# Altium footprint library hphonglib.PcbLib: 703 footprints (part 28 of 44)
Each footprint in its own frame and in the unit in brackets; x right, y up, seen from the top. Pads: shape width x height; smd on the part's side, far side on the other; paste and mask are expansions set on the pad; w line width, h text height; cw(c..) or ccw(c..) is an arc to the next point about the centre after c.
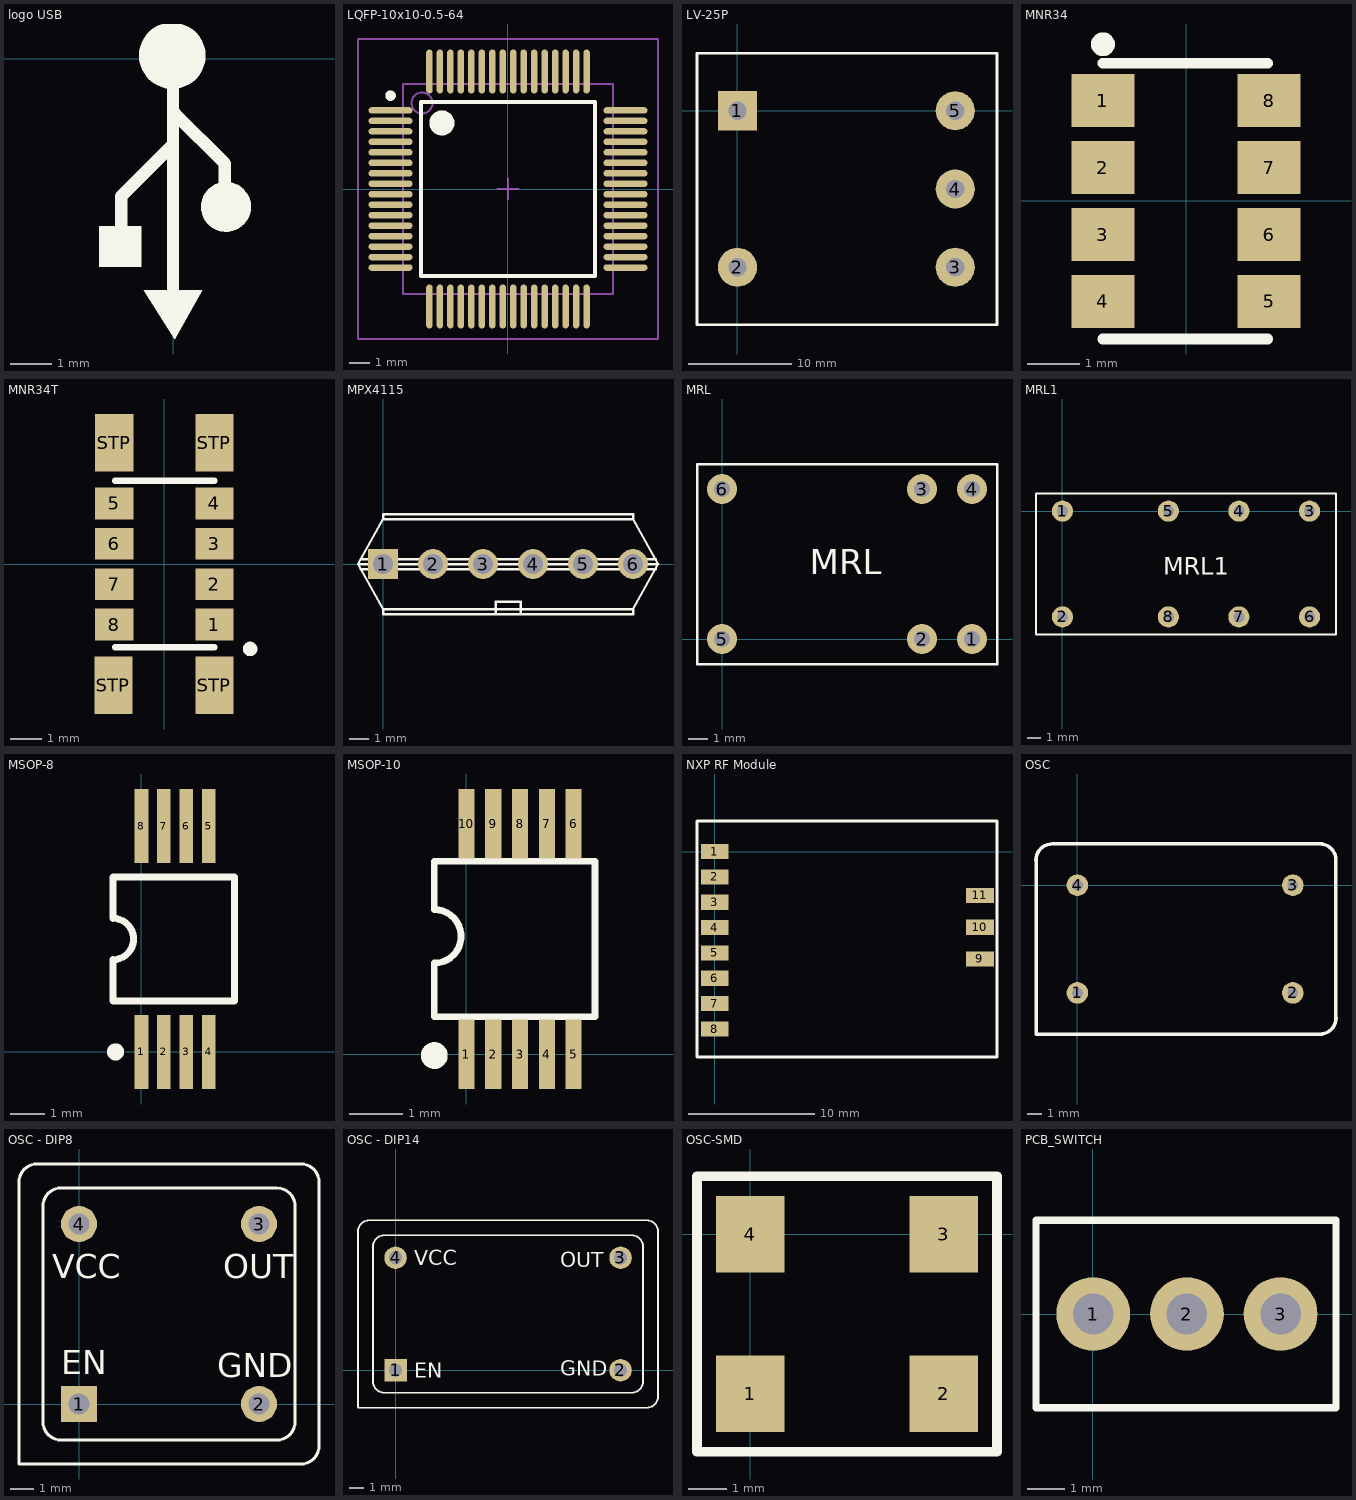
[diagram p27: the footprints below, top view; thin cyan lines are the x and y axes]

## logo USB [mm]
Top Overlay:
  circle w0.8: c-0.019,0.076 r0.4
  circle w0.6: c1.273,-3.556 r0.3
  region: -1.778,-4.014 -1.778,-5.004 -0.762,-5.004 -0.762,-4.014
  region: 0.038,-6.731 -0.699,-5.563 0.698,-5.563
  lines w0.2: 0.025,-1.324 0.05,-1.324
  lines w0.3: -1.245,-4.064 -1.245,-3.328 ; -1.245,-3.302 0,-2.058 ; 0,-5.665 0,-0.483 ; 0.05,-1.324 1.244,-2.518 1.244,-3.48

## LQFP-10x10-0.5-64 [mm] "Thin QFP, 64-Leads, Body 10x10mm, Pitch 0.5mm, IPC Low Density"
height 1.6
pads (64):
  oval 2.1x0.3 smd: 1(-5.6,3.75) 2(-5.6,3.25) 3(-5.6,2.75) 4(-5.6,2.25) 5(-5.6,1.75) 6(-5.6,1.25) 7(-5.6,0.75) 8(-5.6,0.25) 9(-5.6,-0.25) 10(-5.6,-0.75) 11(-5.6,-1.25) 12(-5.6,-1.75) 13(-5.6,-2.25) 14(-5.6,-2.75) 15(-5.6,-3.25) 16(-5.6,-3.75) 33(5.6,-3.75) 34(5.6,-3.25) 35(5.6,-2.75) 36(5.6,-2.25) 37(5.6,-1.75) 38(5.6,-1.25) 39(5.6,-0.75) 40(5.6,-0.25) 41(5.6,0.25) 42(5.6,0.75) 43(5.6,1.25) 44(5.6,1.75) 45(5.6,2.25) 46(5.6,2.75) 47(5.6,3.25) 48(5.6,3.75)
  oval 0.3x2.1 smd: 17(-3.75,-5.6) 18(-3.25,-5.6) 19(-2.75,-5.6) 20(-2.25,-5.6) 21(-1.75,-5.6) 22(-1.25,-5.6) 23(-0.75,-5.6) 24(-0.25,-5.6) 25(0.25,-5.6) 26(0.75,-5.6) 27(1.25,-5.6) 28(1.75,-5.6) 29(2.25,-5.6) 30(2.75,-5.6) 31(3.25,-5.6) 32(3.75,-5.6) 49(3.75,5.6) 50(3.25,5.6) 51(2.75,5.6) 52(2.25,5.6) 53(1.75,5.6) 54(1.25,5.6) 55(0.75,5.6) 56(0.25,5.6) 57(-0.25,5.6) 58(-0.75,5.6) 59(-1.25,5.6) 60(-1.75,5.6) 61(-2.25,5.6) 62(-2.75,5.6) 63(-3.25,5.6) 64(-3.75,5.6)
Top Overlay:
  circle w0.6: c-3.15,3.15 r0.3
  circle w0.25: c-5.6,4.45 r0.125
  lines w0.2: -4.15,-4.15 4.15,-4.15 4.15,4.15 -4.15,4.15 -4.15,-4.15
Mechanical 13:
  circle w0.1: c-4.1,4.1 r0.5
  lines w0.1: -5,-5 5,-5 5,5 -5,5 -5,-5
Mechanical 15:
  lines w0.1: -0.5,0 0.5,0 ; 0,-0.5 0,0.5 ; -7.15,-7.15 7.15,-7.15 7.15,7.15 -7.15,7.15 -7.15,-7.15
3D body: height 1.35, standoff 0, extent -6.014,-6.014 6.014,6.014

## LV-25P [mil] "Voltage Transducer LV Series; 500V"
pads (5):
  rect 150x150 hole 70: 1(0,0)
  round 150 hole 70: 2(0,-600) 3(835,-600) 4(835,-300) 5(835,0)
Top Overlay:
  lines w10: -155,-820 -155,220 995,220 995,-820 -155,-820
3D body: height 624.49, standoff -147.17, extent -104.8,-811.8 1044.8,211.82

## MNR34 [mm]
pads (8):
  rect 1.2x1 smd: 1(-1.578,1.898) 2(-1.578,0.628) 3(-1.578,-0.642) 4(-1.578,-1.912) 5(1.572,-1.912) 6(1.572,-0.642) 7(1.572,0.628) 8(1.572,1.898)
Top Overlay:
  circle w0.254: c-1.578,2.965 r0.1
  lines w0.2: -1.578,-2.623 1.546,-2.623 ; -1.578,2.609 1.546,2.609
3D body: height 1.27, standoff 0, extent -2.032,-2.286 2.032,2.286

## MNR34T [mm]
pads (12):
  rect 1.2x1 smd: 1(1.575,-1.896) 2(1.575,-0.626) 3(1.575,0.644) 4(1.575,1.914) 5(-1.575,1.914) 6(-1.575,0.644) 7(-1.575,-0.626) 8(-1.575,-1.896)
  rect 1.2x1.8 smd: STP(-1.6,-3.801) STP(-1.575,3.819) STP(1.575,-3.801) STP(1.575,3.819)
Top Overlay:
  circle w0.254: c2.694,-2.658 r0.1
  lines w0.2: -1.549,-2.607 1.575,-2.607 ; -1.549,2.625 1.575,2.625
3D body: height 2, standoff 0, extent -1.649,-2.707 1.675,2.725

## MPX4115 [mil]
pads (6):
  rect 60x60 hole 39.37 unplated: 1(0,0)
  round 60 hole 39.37 unplated: 2(100,0) 3(200,0) 4(300,0) 5(400,0) 6(500,0)
Top Overlay:
  lines w5: -45,-10 545,-10 ; -45,10 545,10 ; 225,-100 225,-75 275,-75 275,-100 ; -50,0 550,0 ; -50,0 0,-90 ; -50,0 0,90 ; 0,-90 500,-90 ; 0,-90 0,-100 500,-100 500,-90 ; 0,90 0,100 500,100 500,90 ; 0,90 500,90 ; 500,-90 550,0 ; 500,90 550,0

## MRL [mil]
pads (6):
  round 60 hole 31.49 unplated: 1(500,0) 2(400,0) 3(400,300) 4(500,300) 5(0,0) 6(0,300)
Top Overlay:
  lines w5: -50,-50 550,-50 550,350 -50,350 -50,-50
  text "MRL" at 175,130 h50

## MRL1 [mil]
pads (8):
  round 60 hole 31.49: 1(0,0) 2(0,-300) 3(700,0) 4(500,0) 5(300,0) 6(700,-300) 7(500,-300) 8(300,-300)
Top Overlay:
  lines w5: -75,-350 775,-350 775,50 -75,50 -75,-350
  text "MRL1" at 285,-180 h50

## MSOP-8 [mm] "MSOP, Plastic; 8 Leads; Body 3x3 mm; Pitch 0.65 mm"
height 1.99
pads (8):
  rect 0.4x2.15 smd: 1(0,0) 2(0.65,0) 3(1.3,0) 4(1.95,0) 5(1.95,6.55) 6(1.3,6.55) 7(0.65,6.55) 8(0,6.55)
Top Overlay:
  circle w0.25: c-0.75,0 r0.125
  lines w0.2: 2.7,1.475 -0.825,1.475 -0.825,2.675 ccw(c-0.825,3.275) -0.825,3.875 -0.825,5.075 2.7,5.075 2.7,1.5

## MSOP-10 [mm] "MSOP, Plastic; 10 Leads; Body 3x3 mm; Pitch 0.5 mm"
pads (10):
  rect 0.3x1.3 smd: 1(0,0) 2(0.5,0) 3(1,0) 4(1.5,0) 5(2,0) 6(2,4.3) 7(1.5,4.3) 8(1,4.3) 9(0.5,4.3) 10(0,4.3)
Top Overlay:
  circle w0.25: c-0.6,-0.025 r0.125
  lines w0.127: -0.6,0.7 -0.6,1.7 ccw(c-0.6,2.2) -0.6,2.7 -0.6,3.6 2.4,3.6 2.4,0.7 -0.6,0.7

## NXP RF Module [mm] "NXP Wireless Module"
pads (11):
  rect 2.2x1.2 smd: 1(0,0) 2(0,-2.007) 3(0,-4.013) 4(0,-6.02) 5(0,-8.026) 6(0,-10.033) 7(0,-12.04) 8(0,-14.046) 9(21,-8.5) 10(21,-5.986) 11(21,-3.472)
Top Overlay:
  lines w0.254: -1.397,-16.256 -1.397,2.413 22.352,2.413 22.352,-16.256 -1.397,-16.256

## OSC [mil] "Sealed Oscillator; Through-Hole; 4 Leads"
pads (4):
  round 60 hole 30: 1(0,-300) 2(600,-300) 3(600,0) 4(0,0)
Top Overlay:
  lines w10: -115.21,69.79 cw(c-70,69.79) -70,115 675,115 ; -115,70 -115,-415 675,-415 ccw(c675,-369.79) 720.21,-369.79 ; 674.79,115.21 cw(c674.79,70) 720,70 720,-370
3D body: height 215.03, standoff -225.91, extent -98.62,-398.02 698.63,98.04

## OSC - DIP8 [mil]
pads (4):
  rect 60x60 hole 35.43: 1(0,0)
  round 60 hole 35.43: 2(300,0) 3(300,300) 4(0,300)
Top Overlay:
  lines w5: 359.1,337.28 ccw(c330,330) 330,360 -30,360 ccw(c-30,330) -60,330 -60,-30 ccw(c-30,-30) -30,-60 330,-60 ccw(c330,-30) 360,-30 ; 360,-35 360,335 ; 400,370 ccw(c370,370) 370,400 -70,400 ccw(c-70,370) -100,370 -100,-100 370,-100 ccw(c370,-70) 400,-70 400,375
  text "EN" at -30,50 h40
  text "GND" at 230,45 h40
  text "OUT" at 240,210 h40
  text "VCC" at -45,210 h40

## OSC - DIP14 [mil]
pads (4):
  rect 60x60 hole 35.43: 1(0,0)
  round 60 hole 35.43: 2(600,0) 3(600,300) 4(0,300)
Top Overlay:
  lines w5: -100,-100 670,-100 ccw(c670,-70) 700,-70 700,370 ccw(c670,370) 670,400 -70,400 ccw(c-70,370) -100,370 -100,-100 ; -60,-30 ccw(c-30,-30) -30,-60 630,-60 ccw(c630,-30) 660,-30 660,330 ccw(c630,330) 630,360 -30,360 ccw(c-30,330) -60,330 -60,-30
  text "VCC" at 50,280 h40
  text "OUT" at 440,275 h40
  text "GND" at 440,-15 h40
  text "EN" at 50,-20 h40

## OSC-SMD [mm] "Sealed Oscillator; SMD; 4 Leads"
pads (4):
  rect 1.8x2 smd: 1(0,-4.191) 2(5.08,-4.191) 3(5.08,0) 4(0,0)
Top Overlay:
  lines w0.254: -1.397,-5.715 -1.397,1.524 6.477,1.524 6.477,-5.715 -1.397,-5.715
3D body: height -0.43, standoff -1.74, extent -0.96,-4.587 6.04,0.414

## PCB_SWITCH [mm]
pads (3):
  round 2 hole 1.1: 1(0.011,0.005) 2(2.551,0.005) 3(5.091,0.005)
Top Overlay:
  lines w0.2: -1.539,-2.535 -1.539,2.545 6.591,2.545 6.591,-2.535 -1.539,-2.535
3D body: height 8, standoff 0, extent 0.258,-2.282 4.822,2.282
3D body: height 15, standoff 0, extent 1.816,-0.724 3.264,0.724
3D body: height 5.08, standoff 0, extent -1.524,-2.54 6.604,2.54